# Altium schematic symbol library Regulator_Linear.SchLib: 1452 symbols (part 8 of 10)
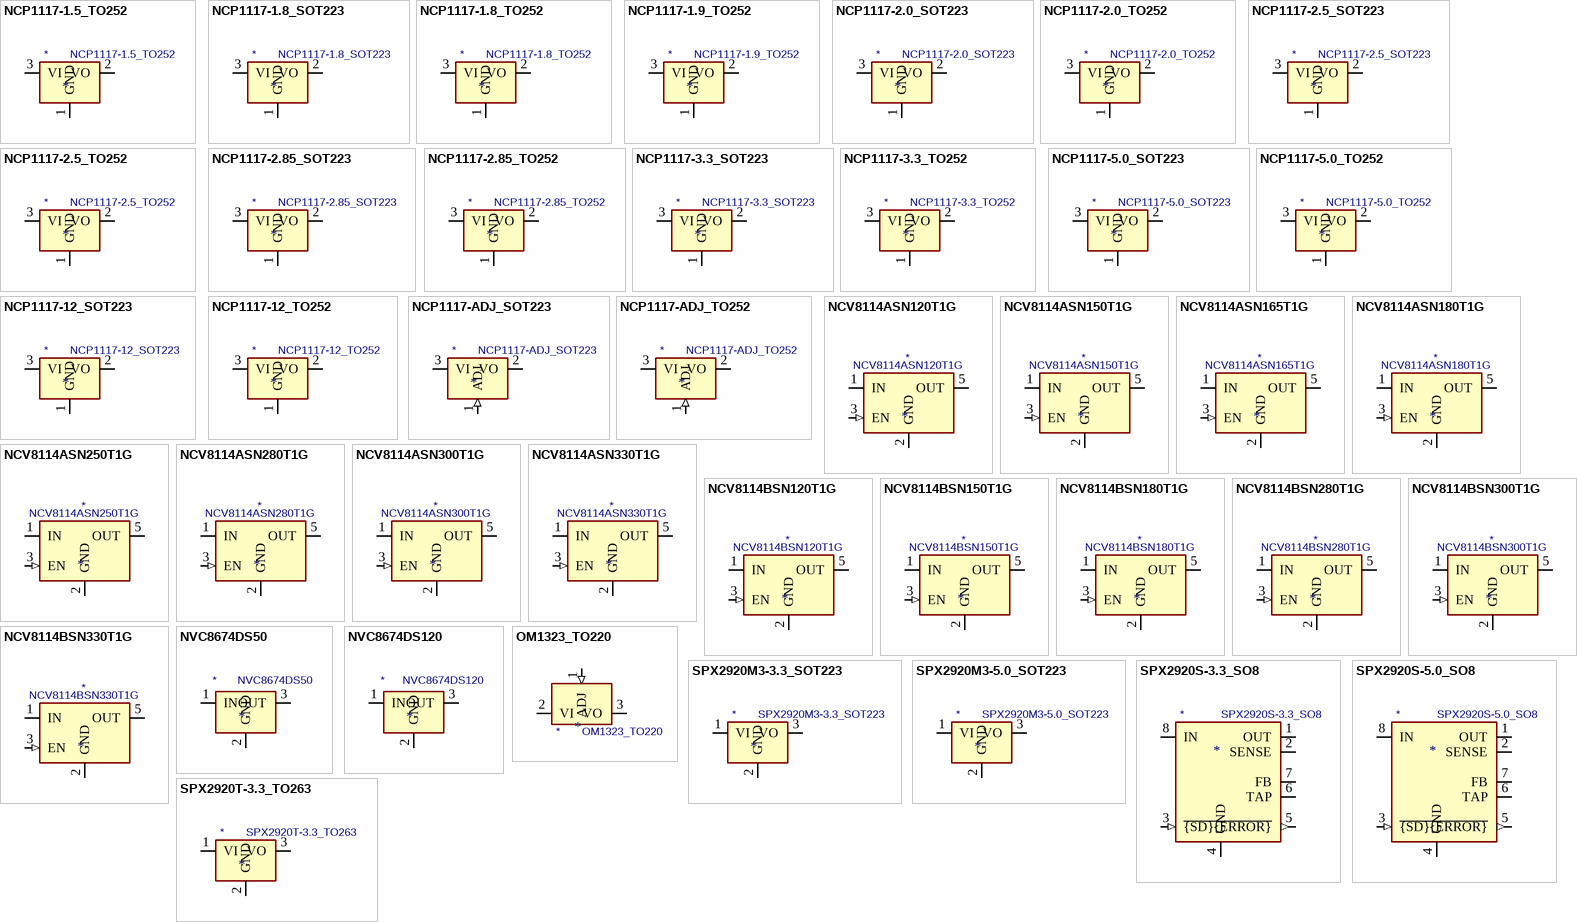
[diagram p43: symbols NCP1117-1.5_TO252 to SPX2920T-3.3_TO263]

## NCV8114ASN150T1G
designator *  value NCV8114ASN150T1G
ki_keywords: linear regulator ldo fixed positive; ki_description: 300mA, Low Noise, Linear Regulator with output active discharge function, 1.7-5.5V input voltage range, 1.5V fixed positive output, TSOT-23-5; ki_fp_filters: TSOT?23*; Footprint: Package_TO_SOT_SMD:TSOT-23-5; Supplier: https://ru.mouser.com/datasheet/2/308/NCV8114-D-1107616.pdf
footprint TSOT-23-5
pins: 1 IN (power), 2 GND (power), 3 EN (in), 4 NC (in) hidden, 5 OUT (power)

## NCV8114ASN165T1G
designator *  value NCV8114ASN165T1G
ki_keywords: linear regulator ldo fixed positive; ki_description: 300mA, Low Noise, Linear Regulator with output active discharge function, 1.7-5.5V input voltage range, 1.65V fixed positive output, TSOT-23-5; ki_fp_filters: TSOT?23*; Footprint: Package_TO_SOT_SMD:TSOT-23-5; Supplier: https://ru.mouser.com/datasheet/2/308/NCV8114-D-1107616.pdf
footprint TSOT-23-5
pins: 1 IN (power), 2 GND (power), 3 EN (in), 4 NC (in) hidden, 5 OUT (power)

## NCV8114ASN180T1G
designator *  value NCV8114ASN180T1G
ki_keywords: linear regulator ldo fixed positive; ki_description: 300mA, Low Noise, Linear Regulator with output active discharge function, 1.7-5.5V input voltage range, 1.8V fixed positive output, TSOT-23-5; ki_fp_filters: TSOT?23*; Footprint: Package_TO_SOT_SMD:TSOT-23-5; Supplier: https://ru.mouser.com/datasheet/2/308/NCV8114-D-1107616.pdf
footprint TSOT-23-5
pins: 1 IN (power), 2 GND (power), 3 EN (in), 4 NC (in) hidden, 5 OUT (power)

## NCV8114ASN250T1G
designator *  value NCV8114ASN250T1G
ki_keywords: linear regulator ldo fixed positive; ki_description: 300mA, Low Noise, Linear Regulator with output active discharge function, 1.7-5.5V input voltage range, 2.5V fixed positive output, TSOT-23-5; ki_fp_filters: TSOT?23*; Footprint: Package_TO_SOT_SMD:TSOT-23-5; Supplier: https://ru.mouser.com/datasheet/2/308/NCV8114-D-1107616.pdf
footprint TSOT-23-5
pins: 1 IN (power), 2 GND (power), 3 EN (in), 4 NC (in) hidden, 5 OUT (power)

## NCV8114ASN280T1G
designator *  value NCV8114ASN280T1G
ki_keywords: linear regulator ldo fixed positive; ki_description: 300mA, Low Noise, Linear Regulator with output active discharge function, 1.7-5.5V input voltage range, 2.8V fixed positive output, TSOT-23-5; ki_fp_filters: TSOT?23*; Footprint: Package_TO_SOT_SMD:TSOT-23-5; Supplier: https://ru.mouser.com/datasheet/2/308/NCV8114-D-1107616.pdf
footprint TSOT-23-5
pins: 1 IN (power), 2 GND (power), 3 EN (in), 4 NC (in) hidden, 5 OUT (power)

## NCV8114ASN300T1G
designator *  value NCV8114ASN300T1G
ki_keywords: linear regulator ldo fixed positive; ki_description: 300mA, Low Noise, Linear Regulator with output active discharge function, 1.7-5.5V input voltage range, 3.0V fixed positive output, TSOT-23-5; ki_fp_filters: TSOT?23*; Footprint: Package_TO_SOT_SMD:TSOT-23-5; Supplier: https://ru.mouser.com/datasheet/2/308/NCV8114-D-1107616.pdf
footprint TSOT-23-5
pins: 1 IN (power), 2 GND (power), 3 EN (in), 4 NC (in) hidden, 5 OUT (power)

## NCV8114ASN330T1G
designator *  value NCV8114ASN330T1G
ki_keywords: linear regulator ldo fixed positive; ki_description: 300mA, Low Noise, Linear Regulator with output active discharge function, 1.7-5.5V input voltage range, 3.3V fixed positive output, TSOT-23-5; ki_fp_filters: TSOT?23*; Footprint: Package_TO_SOT_SMD:TSOT-23-5; Supplier: https://ru.mouser.com/datasheet/2/308/NCV8114-D-1107616.pdf
footprint TSOT-23-5
pins: 1 IN (power), 2 GND (power), 3 EN (in), 4 NC (in) hidden, 5 OUT (power)

## NCV8114BSN120T1G
designator *  value NCV8114BSN120T1G
ki_keywords: linear regulator ldo fixed positive; ki_description: 300mA, Low Noise, Linear Regulator without output active discharge function, 1.7-5.5V input voltage range, 1.2V fixed positive output, TSOT-23-5; ki_fp_filters: TSOT?23*; Footprint: Package_TO_SOT_SMD:TSOT-23-5; Supplier: https://ru.mouser.com/datasheet/2/308/NCV8114-D-1107616.pdf
footprint TSOT-23-5
pins: 1 IN (power), 2 GND (power), 3 EN (in), 4 NC (in) hidden, 5 OUT (power)

## NCV8114BSN150T1G
designator *  value NCV8114BSN150T1G
ki_keywords: linear regulator ldo fixed positive; ki_description: 300mA, Low Noise, Linear Regulator without output active discharge function, 1.7-5.5V input voltage range, 1.5V fixed positive output, TSOT-23-5; ki_fp_filters: TSOT?23*; Footprint: Package_TO_SOT_SMD:TSOT-23-5; Supplier: https://ru.mouser.com/datasheet/2/308/NCV8114-D-1107616.pdf
footprint TSOT-23-5
pins: 1 IN (power), 2 GND (power), 3 EN (in), 4 NC (in) hidden, 5 OUT (power)

## NCV8114BSN180T1G
designator *  value NCV8114BSN180T1G
ki_keywords: linear regulator ldo fixed positive; ki_description: 300mA, Low Noise, Linear Regulator without output active discharge function, 1.7-5.5V input voltage range, 1.8V fixed positive output, TSOT-23-5; ki_fp_filters: TSOT?23*; Footprint: Package_TO_SOT_SMD:TSOT-23-5; Supplier: https://ru.mouser.com/datasheet/2/308/NCV8114-D-1107616.pdf
footprint TSOT-23-5
pins: 1 IN (power), 2 GND (power), 3 EN (in), 4 NC (in) hidden, 5 OUT (power)

## NCV8114BSN280T1G
designator *  value NCV8114BSN280T1G
ki_keywords: linear regulator ldo fixed positive; ki_description: 300mA, Low Noise, Linear Regulator without output active discharge function, 1.7-5.5V input voltage range, 2.8V fixed positive output, TSOT-23-5; ki_fp_filters: TSOT?23*; Footprint: Package_TO_SOT_SMD:TSOT-23-5; Supplier: https://ru.mouser.com/datasheet/2/308/NCV8114-D-1107616.pdf
footprint TSOT-23-5
pins: 1 IN (power), 2 GND (power), 3 EN (in), 4 NC (in) hidden, 5 OUT (power)

## NCV8114BSN300T1G
designator *  value NCV8114BSN300T1G
ki_keywords: linear regulator ldo fixed positive; ki_description: 300mA, Low Noise, Linear Regulator without output active discharge function, 1.7-5.5V input voltage range, 3.0V fixed positive output, TSOT-23-5; ki_fp_filters: TSOT?23*; Footprint: Package_TO_SOT_SMD:TSOT-23-5; Supplier: https://ru.mouser.com/datasheet/2/308/NCV8114-D-1107616.pdf
footprint TSOT-23-5
pins: 1 IN (power), 2 GND (power), 3 EN (in), 4 NC (in) hidden, 5 OUT (power)

## NCV8114BSN330T1G
designator *  value NCV8114BSN330T1G
ki_keywords: linear regulator ldo fixed positive; ki_description: 300mA, Low Noise, Linear Regulator without output active discharge function, 1.7-5.5V input voltage range, 3.3V fixed positive output, TSOT-23-5; ki_fp_filters: TSOT?23*; Footprint: Package_TO_SOT_SMD:TSOT-23-5; Supplier: https://ru.mouser.com/datasheet/2/308/NCV8114-D-1107616.pdf
footprint TSOT-23-5
pins: 1 IN (power), 2 GND (power), 3 EN (in), 4 NC (in) hidden, 5 OUT (power)

## NVC8674DS50
designator *  value NVC8674DS50
ki_keywords: ldo regulator 5V; ki_description: 350mA, 5.0V Very Low Iq Low Dropout Linear Regulator, TO-263-2; ki_fp_filters: TO*263*; Footprint: Package_TO_SOT_SMD:TO-263-2; Supplier: https://www.onsemi.com/pub/Collateral/NCV8674-D.PDF
footprint TO-263-2
pins: 1 IN (power), 2 GND (power), 3 OUT (power)

## NVC8674DS120
designator *  value NVC8674DS120
ki_keywords: ldo regulator 12V; ki_description: 350mA, 12.0V Very Low Iq Low Dropout Linear Regulator, TO-263-2; ki_fp_filters: TO*263*; Footprint: Package_TO_SOT_SMD:TO-263-2; Supplier: https://www.onsemi.com/pub/Collateral/NCV8674-D.PDF
footprint TO-263-2
pins: 1 IN (power), 2 GND (power), 3 OUT (power)

## OM1323_TO220
designator *  value OM1323_TO220
ki_keywords: Adjustable Voltage Regulator 1.5A Negative; ki_description: Negative 1.5A 35V Adjustable Linear Regulator, TO-220; ki_fp_filters: TO?220*; Footprint: Package_TO_SOT_THT:TO-220-3_Vertical; Supplier: http://www.irf.com/product-info/datasheets/hirel/om1323.pdf
footprint TO-220-3_Vertical
pins: 1 ADJ (in), 2 VI (power), 3 VO (power)

## SPX2920M3-3.3_SOT223
designator *  value SPX2920M3-3.3_SOT223
ki_keywords: REGULATOR LDO 3.3V; ki_description: 400mA Low drop-out regulator, Fixed Output 3.3V, SOT-223; ki_fp_filters: SOT?223*; Footprint: Package_TO_SOT_SMD:SOT-223-3_TabPin2; Supplier: http://www.zlgmcu.com/Sipex/LDO/PDF/spx2920.pdf
footprint SOT-223-3_TabPin2
pins: 1 VI (power), 2 GND (power), 3 VO (power)

## SPX2920M3-5.0_SOT223
designator *  value SPX2920M3-5.0_SOT223
ki_keywords: REGULATOR LDO 5V; ki_description: 400mA Low drop-out regulator, Fixed Output 5V, SOT-223; ki_fp_filters: SOT?223*; Footprint: Package_TO_SOT_SMD:SOT-223-3_TabPin2; Supplier: http://www.zlgmcu.com/Sipex/LDO/PDF/spx2920.pdf
footprint SOT-223-3_TabPin2
pins: 1 VI (power), 2 GND (power), 3 VO (power)

## SPX2920S-3.3_SO8
designator *  value SPX2920S-3.3_SO8
ki_keywords: LDO Voltage Regulator 400mA 3.3V Adjustable; ki_description: 400mA Fixed/Adjustable 1.2-20V Low Drop-out Voltage Regulator, SO-8; ki_fp_filters: SOIC*3.9x4.9mm*P1.27mm*; Footprint: Package_SO:SOIC-8_3.9x4.9mm_P1.27mm; Supplier: http://www.zlgmcu.com/Sipex/LDO/PDF/spx2920.pdf
footprint SOIC-8_3.9x4.9mm_P1.27mm
pins: 1 OUT (power), 2 SENSE, 3 ~{{SD}} (in), 4 GND (power), 5 ~{{ERROR}} (out), 6 TAP, 7 FB, 8 IN (power)

## SPX2920S-5.0_SO8
designator *  value SPX2920S-5.0_SO8
ki_keywords: LDO Voltage Regulator 400mA 5V Adjustable; ki_description: 400mA Fixed/Adjustable 1.2-20V Low Drop-out Voltage Regulator, SO-8; ki_fp_filters: SOIC*3.9x4.9mm*P1.27mm*; Footprint: Package_SO:SOIC-8_3.9x4.9mm_P1.27mm; Supplier: http://www.zlgmcu.com/Sipex/LDO/PDF/spx2920.pdf
footprint SOIC-8_3.9x4.9mm_P1.27mm
pins: 1 OUT (power), 2 SENSE, 3 ~{{SD}} (in), 4 GND (power), 5 ~{{ERROR}} (out), 6 TAP, 7 FB, 8 IN (power)

## SPX2920T-3.3_TO263
designator *  value SPX2920T-3.3_TO263
ki_keywords: REGULATOR LDO 3.3V; ki_description: 400mA Low drop-out regulator, Fixed Output 3.3V, TO-263; ki_fp_filters: TO?263*; Footprint: Package_TO_SOT_SMD:TO-263-3_TabPin2; Supplier: http://www.zlgmcu.com/Sipex/LDO/PDF/spx2920.pdf
footprint TO-263-3_TabPin2
pins: 1 VI (power), 2 GND (power), 3 VO (power)

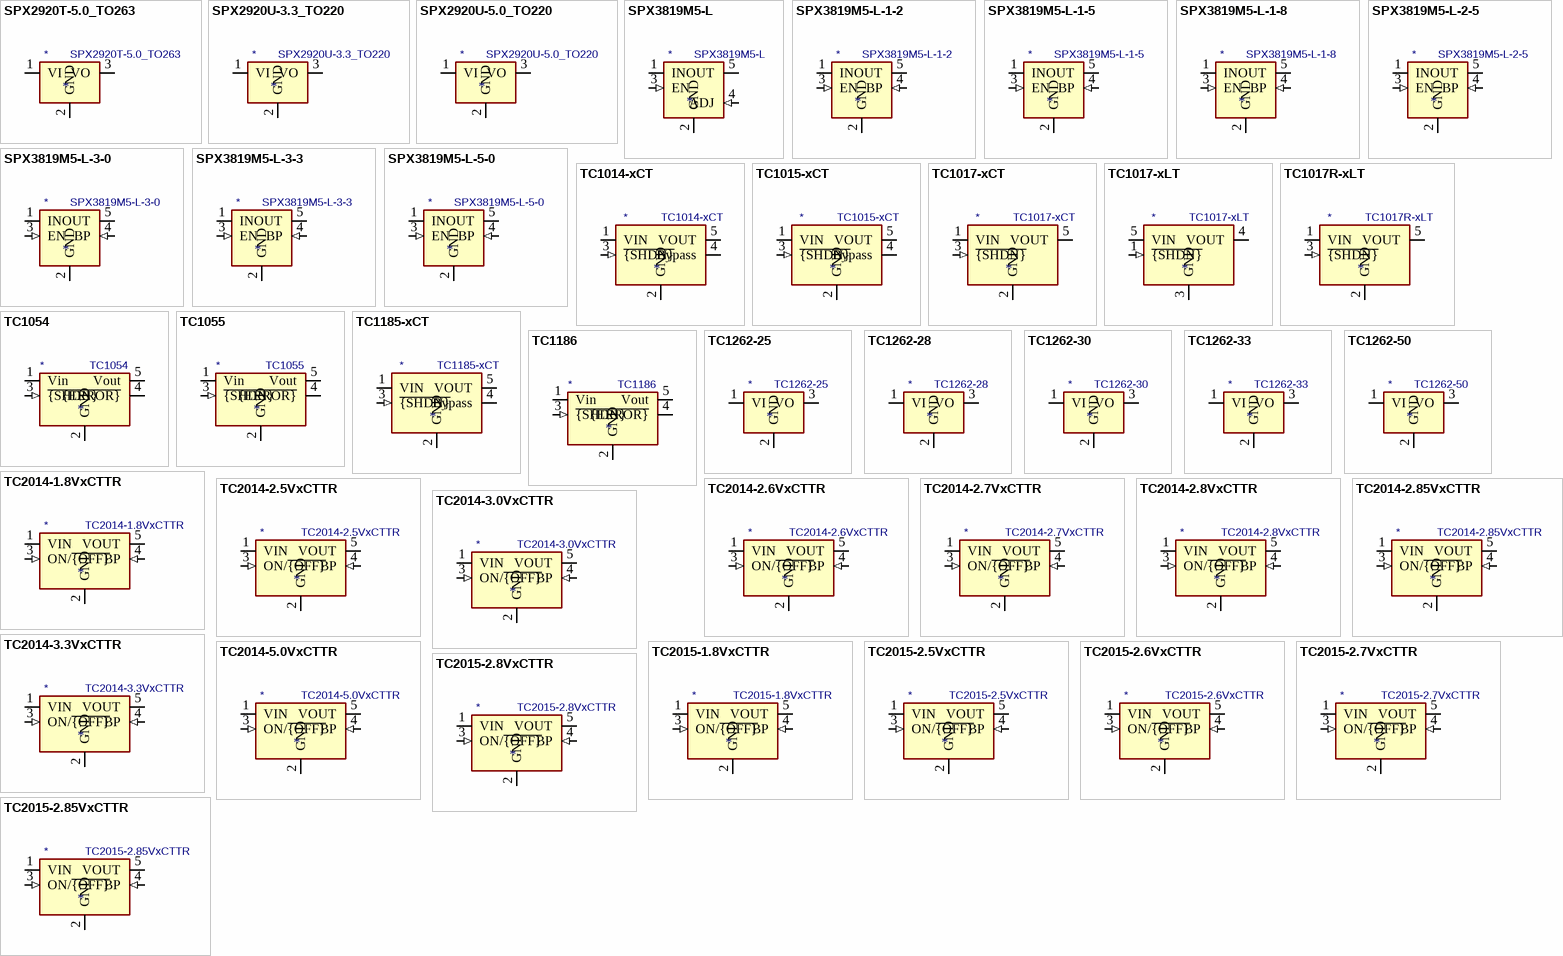
[diagram p28: symbols SPX2920T-5.0_TO263 to TC2015-2.85VxCTTR]

## SPX2920T-5.0_TO263
designator *  value SPX2920T-5.0_TO263
ki_keywords: REGULATOR LDO 5V; ki_description: 400mA Low drop-out regulator, Fixed Output 5V, TO-263; ki_fp_filters: TO?263*; Footprint: Package_TO_SOT_SMD:TO-263-3_TabPin2; Supplier: http://www.zlgmcu.com/Sipex/LDO/PDF/spx2920.pdf
footprint TO-263-3_TabPin2
pins: 1 VI (power), 2 GND (power), 3 VO (power)

## SPX2920U-3.3_TO220
designator *  value SPX2920U-3.3_TO220
ki_keywords: REGULATOR LDO 3.3V; ki_description: 400mA Low drop-out regulator, Fixed Output 3.3V, TO-220; ki_fp_filters: TO?220*; Footprint: Package_TO_SOT_THT:TO-220-3_Vertical; Supplier: http://www.zlgmcu.com/Sipex/LDO/PDF/spx2920.pdf
footprint TO-220-3_Vertical
pins: 1 VI (power), 2 GND (power), 3 VO (power)

## SPX2920U-5.0_TO220
designator *  value SPX2920U-5.0_TO220
ki_keywords: REGULATOR LDO 5V; ki_description: 400mA Low drop-out regulator, Fixed Output 5V, TO-220; ki_fp_filters: TO?220*; Footprint: Package_TO_SOT_THT:TO-220-3_Vertical; Supplier: http://www.zlgmcu.com/Sipex/LDO/PDF/spx2920.pdf
footprint TO-220-3_Vertical
pins: 1 VI (power), 2 GND (power), 3 VO (power)

## SPX3819M5-L
designator *  value SPX3819M5-L
ki_keywords: REGULATOR LDO ADJ; ki_description: 500mA Low drop-out regulator, Adjustable, SOT-23-5; ki_fp_filters: SOT?23*; Footprint: Package_TO_SOT_SMD:SOT-23-5; Supplier: https://www.exar.com/content/document.ashx?id=22106&languageid=1033&type=Datasheet&partnumber=SPX3819&filename=SPX3819.pdf&part=SPX3819
footprint SOT-23-5
pins: 1 IN (power), 2 GND (power), 3 EN (in), 4 ADJ (in), 5 OUT (power)

## SPX3819M5-L-1-2
designator *  value SPX3819M5-L-1-2
ki_keywords: REGULATOR LDO 1.2V; ki_description: 500mA Low drop-out regulator, Fixed Output 1.2V, SOT-23-5; ki_fp_filters: SOT?23*; Footprint: Package_TO_SOT_SMD:SOT-23-5; Supplier: https://www.exar.com/content/document.ashx?id=22106&languageid=1033&type=Datasheet&partnumber=SPX3819&filename=SPX3819.pdf&part=SPX3819
footprint SOT-23-5
pins: 1 IN (power), 2 GND (power), 3 EN (in), 4 BP (in), 5 OUT (power)

## SPX3819M5-L-1-5
designator *  value SPX3819M5-L-1-5
ki_keywords: REGULATOR LDO 1.5V; ki_description: 500mA Low drop-out regulator, Fixed Output 1.5V, SOT-23-5; ki_fp_filters: SOT?23*; Footprint: Package_TO_SOT_SMD:SOT-23-5; Supplier: https://www.exar.com/content/document.ashx?id=22106&languageid=1033&type=Datasheet&partnumber=SPX3819&filename=SPX3819.pdf&part=SPX3819
footprint SOT-23-5
pins: 1 IN (power), 2 GND (power), 3 EN (in), 4 BP (in), 5 OUT (power)

## SPX3819M5-L-1-8
designator *  value SPX3819M5-L-1-8
ki_keywords: REGULATOR LDO 1.8V; ki_description: 500mA Low drop-out regulator, Fixed Output 1.8V, SOT-23-5; ki_fp_filters: SOT?23*; Footprint: Package_TO_SOT_SMD:SOT-23-5; Supplier: https://www.exar.com/content/document.ashx?id=22106&languageid=1033&type=Datasheet&partnumber=SPX3819&filename=SPX3819.pdf&part=SPX3819
footprint SOT-23-5
pins: 1 IN (power), 2 GND (power), 3 EN (in), 4 BP (in), 5 OUT (power)

## SPX3819M5-L-2-5
designator *  value SPX3819M5-L-2-5
ki_keywords: REGULATOR LDO 2.5V; ki_description: 500mA Low drop-out regulator, Fixed Output 2.5V, SOT-23-5; ki_fp_filters: SOT?23*; Footprint: Package_TO_SOT_SMD:SOT-23-5; Supplier: https://www.exar.com/content/document.ashx?id=22106&languageid=1033&type=Datasheet&partnumber=SPX3819&filename=SPX3819.pdf&part=SPX3819
footprint SOT-23-5
pins: 1 IN (power), 2 GND (power), 3 EN (in), 4 BP (in), 5 OUT (power)

## SPX3819M5-L-3-0
designator *  value SPX3819M5-L-3-0
ki_keywords: REGULATOR LDO 3.0V; ki_description: 500mA Low drop-out regulator, Fixed Output 3.0V, SOT-23-5; ki_fp_filters: SOT?23*; Footprint: Package_TO_SOT_SMD:SOT-23-5; Supplier: https://www.exar.com/content/document.ashx?id=22106&languageid=1033&type=Datasheet&partnumber=SPX3819&filename=SPX3819.pdf&part=SPX3819
footprint SOT-23-5
pins: 1 IN (power), 2 GND (power), 3 EN (in), 4 BP (in), 5 OUT (power)

## SPX3819M5-L-3-3
designator *  value SPX3819M5-L-3-3
ki_keywords: REGULATOR LDO 3.3V; ki_description: 500mA Low drop-out regulator, Fixed Output 3.3V, SOT-23-5; ki_fp_filters: SOT?23*; Footprint: Package_TO_SOT_SMD:SOT-23-5; Supplier: https://www.exar.com/content/document.ashx?id=22106&languageid=1033&type=Datasheet&partnumber=SPX3819&filename=SPX3819.pdf&part=SPX3819
footprint SOT-23-5
pins: 1 IN (power), 2 GND (power), 3 EN (in), 4 BP (in), 5 OUT (power)

## SPX3819M5-L-5-0
designator *  value SPX3819M5-L-5-0
ki_keywords: REGULATOR LDO 5.0V; ki_description: 500mA Low drop-out regulator, Fixed Output 5.0V, SOT-23-5; ki_fp_filters: SOT?23*; Footprint: Package_TO_SOT_SMD:SOT-23-5; Supplier: https://www.exar.com/content/document.ashx?id=22106&languageid=1033&type=Datasheet&partnumber=SPX3819&filename=SPX3819.pdf&part=SPX3819
footprint SOT-23-5
pins: 1 IN (power), 2 GND (power), 3 EN (in), 4 BP (in), 5 OUT (power)

## TC1014-xCT
designator *  value TC1014-xCT
ki_keywords: LDO Linear Voltage Regulator; ki_description: 50 mA CMOS LDOs with Shutdown and Reference Bypass, SOT-23-5; ki_fp_filters: SOT?23*; Footprint: Package_TO_SOT_SMD:SOT-23-5; Supplier: https://ww1.microchip.com/downloads/aemDocuments/documents/APID/ProductDocuments/DataSheets/21335e.pdf
footprint SOT-23-5
pins: 1 VIN (power), 2 GND (power), 3 ~{{SHDN}} (in), 4 Bypass, 5 VOUT (power)

## TC1015-xCT
designator *  value TC1015-xCT
ki_keywords: LDO Linear Voltage Regulator; ki_description: 100 mA CMOS LDOs with Shutdown and Reference Bypass, SOT-23-5; ki_fp_filters: SOT?23*; Footprint: Package_TO_SOT_SMD:SOT-23-5; Supplier: https://ww1.microchip.com/downloads/aemDocuments/documents/APID/ProductDocuments/DataSheets/21335e.pdf
footprint SOT-23-5
pins: 1 VIN (power), 2 GND (power), 3 ~{{SHDN}} (in), 4 Bypass, 5 VOUT (power)

## TC1017-xCT
designator *  value TC1017-xCT
ki_keywords: LDO Linear Voltage Regulator; ki_description: 150mA, Tiny CMOS LDO With Shutdown, SOT-23-5; ki_fp_filters: SOT?23*; Footprint: Package_TO_SOT_SMD:SOT-23-5; Supplier: http://ww1.microchip.com/downloads/en/DeviceDoc/21813F.pdf
footprint SOT-23-5
pins: 1 VIN (power), 2 GND (power), 3 ~{{SHDN}} (in), 4 NC (in) hidden, 5 VOUT (power)

## TC1017-xLT
designator *  value TC1017-xLT
ki_keywords: LDO Linear Voltage Regulator; ki_description: 150mA, Tiny CMOS LDO With Shutdown, SC-70-5; ki_fp_filters: SOT*353*; Footprint: Package_TO_SOT_SMD:SOT-353_SC-70-5; Supplier: http://ww1.microchip.com/downloads/en/DeviceDoc/21813F.pdf
footprint SOT-353_SC-70-5
pins: 1 ~{{SHDN}} (in), 2 NC (in) hidden, 3 GND (power), 4 VOUT (power), 5 VIN (power)

## TC1017R-xLT
designator *  value TC1017R-xLT
ki_keywords: LDO Linear Voltage Regulator; ki_description: 150mA, Tiny CMOS LDO With Shutdown, SC-70-5; ki_fp_filters: SOT*353*; Footprint: Package_TO_SOT_SMD:SOT-353_SC-70-5; Supplier: http://ww1.microchip.com/downloads/en/DeviceDoc/21813F.pdf
footprint SOT-353_SC-70-5
pins: 1 VIN (power), 2 GND (power), 3 ~{{SHDN}} (in), 4 NC (in) hidden, 5 VOUT (power)

## TC1054
designator *  value TC1054
ki_keywords: LDO regulator voltage; ki_description: 50mA Low Dropout Regulator with ERROR output in 5-Pin SOT-23 package; ki_fp_filters: SOT?23*; Footprint: Package_TO_SOT_SMD:SOT-23-5; Supplier: http://ww1.microchip.com/downloads/en/DeviceDoc/21350E.pdf
footprint SOT-23-5
pins: 1 Vin (power), 2 GND (power), 3 ~{{SHDN}} (in), 4 ~{{ERROR}} (oc), 5 Vout (power)

## TC1055
designator *  value TC1055
ki_keywords: LDO regulator voltage; ki_description: 100mA Low Dropout Regulator with ERROR output in 5-Pin SOT-23 package; ki_fp_filters: SOT?23*; Footprint: Package_TO_SOT_SMD:SOT-23-5; Supplier: http://ww1.microchip.com/downloads/en/DeviceDoc/21350E.pdf
footprint SOT-23-5
pins: 1 Vin (power), 2 GND (power), 3 ~{{SHDN}} (in), 4 ~{{ERROR}} (oc), 5 Vout (power)

## TC1185-xCT
designator *  value TC1185-xCT
ki_keywords: LDO Linear Voltage Regulator; ki_description: 150 mA CMOS LDOs with Shutdown and Reference Bypass, SOT-23-5; ki_fp_filters: SOT?23*; Footprint: Package_TO_SOT_SMD:SOT-23-5; Supplier: https://ww1.microchip.com/downloads/aemDocuments/documents/APID/ProductDocuments/DataSheets/21335e.pdf
footprint SOT-23-5
pins: 1 VIN (power), 2 GND (power), 3 ~{{SHDN}} (in), 4 Bypass, 5 VOUT (power)

## TC1186
designator *  value TC1186
ki_keywords: LDO regulator voltage; ki_description: 150mA Low Dropout Regulator with ERROR output in 5-Pin SOT-23 package; ki_fp_filters: SOT?23*; Footprint: Package_TO_SOT_SMD:SOT-23-5; Supplier: http://ww1.microchip.com/downloads/en/DeviceDoc/21350E.pdf
footprint SOT-23-5
pins: 1 Vin (power), 2 GND (power), 3 ~{{SHDN}} (in), 4 ~{{ERROR}} (oc), 5 Vout (power)

## TC1262-25
designator *  value TC1262-25
ki_keywords: Voltage Regulator 2.5V 500mA Positive CMOS LDO Microchip; ki_description: 500mA Low Dropout CMOS Voltage Regulator, Fixed Output 2.5V, TO-220/SOT-223/TO-263; ki_fp_filters: SOT?223* TO?220* TO?263*; Supplier: http://ww1.microchip.com/downloads/en/DeviceDoc/21373C.pdf
pins: 1 VI (power), 2 GND (power), 3 VO (power)

## TC1262-28
designator *  value TC1262-28
ki_keywords: Voltage Regulator 2.8V 500mA Positive CMOS LDO Microchip; ki_description: 500mA Low Dropout CMOS Voltage Regulator, Fixed Output 2.8V, TO-220/SOT-223/TO-263; ki_fp_filters: SOT?223* TO?220* TO?263*; Supplier: http://ww1.microchip.com/downloads/en/DeviceDoc/21373C.pdf
pins: 1 VI (power), 2 GND (power), 3 VO (power)

## TC1262-30
designator *  value TC1262-30
ki_keywords: Voltage Regulator 3.0V 500mA Positive CMOS LDO Microchip; ki_description: 500mA Low Dropout CMOS Voltage Regulator, Fixed Output 3.0V, TO-220/SOT-223/TO-263; ki_fp_filters: SOT?223* TO?220* TO?263*; Supplier: http://ww1.microchip.com/downloads/en/DeviceDoc/21373C.pdf
pins: 1 VI (power), 2 GND (power), 3 VO (power)

## TC1262-33
designator *  value TC1262-33
ki_keywords: Voltage Regulator 3.3V 500mA Positive CMOS LDO Microchip; ki_description: 500mA Low Dropout CMOS Voltage Regulator, Fixed Output 3.3V, TO-220/SOT-223/TO-263; ki_fp_filters: SOT?223* TO?220* TO?263*; Supplier: http://ww1.microchip.com/downloads/en/DeviceDoc/21373C.pdf
pins: 1 VI (power), 2 GND (power), 3 VO (power)

## TC1262-50
designator *  value TC1262-50
ki_keywords: Voltage Regulator 5.0V 500mA Positive CMOS LDO Microchip; ki_description: 500mA Low Dropout CMOS Voltage Regulator, Fixed Output 5.0V, TO-220/SOT-223/TO-263; ki_fp_filters: SOT?223* TO?220* TO?263*; Supplier: http://ww1.microchip.com/downloads/en/DeviceDoc/21373C.pdf
pins: 1 VI (power), 2 GND (power), 3 VO (power)

## TC2014-1.8VxCTTR
designator *  value TC2014-1.8VxCTTR
ki_keywords: low dropout 1.8V 50mA; ki_description: 1.8V 50mA CMOS LDO with Shutdown and Vref Bypass, SOT-23-5; ki_fp_filters: SOT?23*; Footprint: Package_TO_SOT_SMD:SOT-23-5; Supplier: http://ww1.microchip.com/downloads/en/DeviceDoc/21662F.pdf
footprint SOT-23-5
pins: 1 VIN (power), 2 GND (power), 3 ON/~{{OFF}} (in), 4 BP (in), 5 VOUT (power)

## TC2014-2.5VxCTTR
designator *  value TC2014-2.5VxCTTR
ki_keywords: low dropout 2.5V 50mA; ki_description: 2.5V 50mA CMOS LDO with Shutdown and Vref Bypass, SOT-23-5; ki_fp_filters: SOT?23*; Footprint: Package_TO_SOT_SMD:SOT-23-5; Supplier: http://ww1.microchip.com/downloads/en/DeviceDoc/21662F.pdf
footprint SOT-23-5
pins: 1 VIN (power), 2 GND (power), 3 ON/~{{OFF}} (in), 4 BP (in), 5 VOUT (power)

## TC2014-2.6VxCTTR
designator *  value TC2014-2.6VxCTTR
ki_keywords: low dropout 2.6V 50mA; ki_description: 2.6V 50mA CMOS LDO with Shutdown and Vref Bypass, SOT-23-5; ki_fp_filters: SOT?23*; Footprint: Package_TO_SOT_SMD:SOT-23-5; Supplier: http://ww1.microchip.com/downloads/en/DeviceDoc/21662F.pdf
footprint SOT-23-5
pins: 1 VIN (power), 2 GND (power), 3 ON/~{{OFF}} (in), 4 BP (in), 5 VOUT (power)

## TC2014-2.7VxCTTR
designator *  value TC2014-2.7VxCTTR
ki_keywords: low dropout 2.7V 50mA; ki_description: 2.7V 50mA CMOS LDO with Shutdown and Vref Bypass, SOT-23-5; ki_fp_filters: SOT?23*; Footprint: Package_TO_SOT_SMD:SOT-23-5; Supplier: http://ww1.microchip.com/downloads/en/DeviceDoc/21662F.pdf
footprint SOT-23-5
pins: 1 VIN (power), 2 GND (power), 3 ON/~{{OFF}} (in), 4 BP (in), 5 VOUT (power)

## TC2014-2.8VxCTTR
designator *  value TC2014-2.8VxCTTR
ki_keywords: low dropout 2.8V 50mA; ki_description: 2.8V 50mA CMOS LDO with Shutdown and Vref Bypass, SOT-23-5; ki_fp_filters: SOT?23*; Footprint: Package_TO_SOT_SMD:SOT-23-5; Supplier: http://ww1.microchip.com/downloads/en/DeviceDoc/21662F.pdf
footprint SOT-23-5
pins: 1 VIN (power), 2 GND (power), 3 ON/~{{OFF}} (in), 4 BP (in), 5 VOUT (power)

## TC2014-2.85VxCTTR
designator *  value TC2014-2.85VxCTTR
ki_keywords: low dropout 2.85V 50mA; ki_description: 2.85V 50mA CMOS LDO with Shutdown and Vref Bypass, SOT-23-5; ki_fp_filters: SOT?23*; Footprint: Package_TO_SOT_SMD:SOT-23-5; Supplier: http://ww1.microchip.com/downloads/en/DeviceDoc/21662F.pdf
footprint SOT-23-5
pins: 1 VIN (power), 2 GND (power), 3 ON/~{{OFF}} (in), 4 BP (in), 5 VOUT (power)

## TC2014-3.0VxCTTR
designator *  value TC2014-3.0VxCTTR
ki_keywords: low dropout 3.0V 50mA; ki_description: 3.0V 50mA CMOS LDO with Shutdown and Vref Bypass, SOT-23-5; ki_fp_filters: SOT?23*; Footprint: Package_TO_SOT_SMD:SOT-23-5; Supplier: http://ww1.microchip.com/downloads/en/DeviceDoc/21662F.pdf
footprint SOT-23-5
pins: 1 VIN (power), 2 GND (power), 3 ON/~{{OFF}} (in), 4 BP (in), 5 VOUT (power)

## TC2014-3.3VxCTTR
designator *  value TC2014-3.3VxCTTR
ki_keywords: low dropout 3.3V 50mA; ki_description: 3.3V 50mA CMOS LDO with Shutdown and Vref Bypass, SOT-23-5; ki_fp_filters: SOT?23*; Footprint: Package_TO_SOT_SMD:SOT-23-5; Supplier: http://ww1.microchip.com/downloads/en/DeviceDoc/21662F.pdf
footprint SOT-23-5
pins: 1 VIN (power), 2 GND (power), 3 ON/~{{OFF}} (in), 4 BP (in), 5 VOUT (power)

## TC2014-5.0VxCTTR
designator *  value TC2014-5.0VxCTTR
ki_keywords: low dropout 5.0V 50mA; ki_description: 5.0V 50mA CMOS LDO with Shutdown and Vref Bypass, SOT-23-5; ki_fp_filters: SOT?23*; Footprint: Package_TO_SOT_SMD:SOT-23-5; Supplier: http://ww1.microchip.com/downloads/en/DeviceDoc/21662F.pdf
footprint SOT-23-5
pins: 1 VIN (power), 2 GND (power), 3 ON/~{{OFF}} (in), 4 BP (in), 5 VOUT (power)

## TC2015-1.8VxCTTR
designator *  value TC2015-1.8VxCTTR
ki_keywords: low dropout 1.8V 100mA; ki_description: 1.8V 100mA CMOS LDO with Shutdown and Vref Bypass, SOT-23-5; ki_fp_filters: SOT?23*; Footprint: Package_TO_SOT_SMD:SOT-23-5; Supplier: http://ww1.microchip.com/downloads/en/DeviceDoc/21662F.pdf
footprint SOT-23-5
pins: 1 VIN (power), 2 GND (power), 3 ON/~{{OFF}} (in), 4 BP (in), 5 VOUT (power)

## TC2015-2.5VxCTTR
designator *  value TC2015-2.5VxCTTR
ki_keywords: low dropout 2.5V 100mA; ki_description: 2.5V 100mA CMOS LDO with Shutdown and Vref Bypass, SOT-23-5; ki_fp_filters: SOT?23*; Footprint: Package_TO_SOT_SMD:SOT-23-5; Supplier: http://ww1.microchip.com/downloads/en/DeviceDoc/21662F.pdf
footprint SOT-23-5
pins: 1 VIN (power), 2 GND (power), 3 ON/~{{OFF}} (in), 4 BP (in), 5 VOUT (power)

## TC2015-2.6VxCTTR
designator *  value TC2015-2.6VxCTTR
ki_keywords: low dropout 2.6V 100mA; ki_description: 2.6V 100mA CMOS LDO with Shutdown and Vref Bypass, SOT-23-5; ki_fp_filters: SOT?23*; Footprint: Package_TO_SOT_SMD:SOT-23-5; Supplier: http://ww1.microchip.com/downloads/en/DeviceDoc/21662F.pdf
footprint SOT-23-5
pins: 1 VIN (power), 2 GND (power), 3 ON/~{{OFF}} (in), 4 BP (in), 5 VOUT (power)

## TC2015-2.7VxCTTR
designator *  value TC2015-2.7VxCTTR
ki_keywords: low dropout 2.7V 100mA; ki_description: 2.7V 100mA CMOS LDO with Shutdown and Vref Bypass, SOT-23-5; ki_fp_filters: SOT?23*; Footprint: Package_TO_SOT_SMD:SOT-23-5; Supplier: http://ww1.microchip.com/downloads/en/DeviceDoc/21662F.pdf
footprint SOT-23-5
pins: 1 VIN (power), 2 GND (power), 3 ON/~{{OFF}} (in), 4 BP (in), 5 VOUT (power)

## TC2015-2.8VxCTTR
designator *  value TC2015-2.8VxCTTR
ki_keywords: low dropout 2.8V 100mA; ki_description: 2.8V 100mA CMOS LDO with Shutdown and Vref Bypass, SOT-23-5; ki_fp_filters: SOT?23*; Footprint: Package_TO_SOT_SMD:SOT-23-5; Supplier: http://ww1.microchip.com/downloads/en/DeviceDoc/21662F.pdf
footprint SOT-23-5
pins: 1 VIN (power), 2 GND (power), 3 ON/~{{OFF}} (in), 4 BP (in), 5 VOUT (power)

## TC2015-2.85VxCTTR
designator *  value TC2015-2.85VxCTTR
ki_keywords: low dropout 2.85V 100mA; ki_description: 2.85V 100mA CMOS LDO with Shutdown and Vref Bypass, SOT-23-5; ki_fp_filters: SOT?23*; Footprint: Package_TO_SOT_SMD:SOT-23-5; Supplier: http://ww1.microchip.com/downloads/en/DeviceDoc/21662F.pdf
footprint SOT-23-5
pins: 1 VIN (power), 2 GND (power), 3 ON/~{{OFF}} (in), 4 BP (in), 5 VOUT (power)

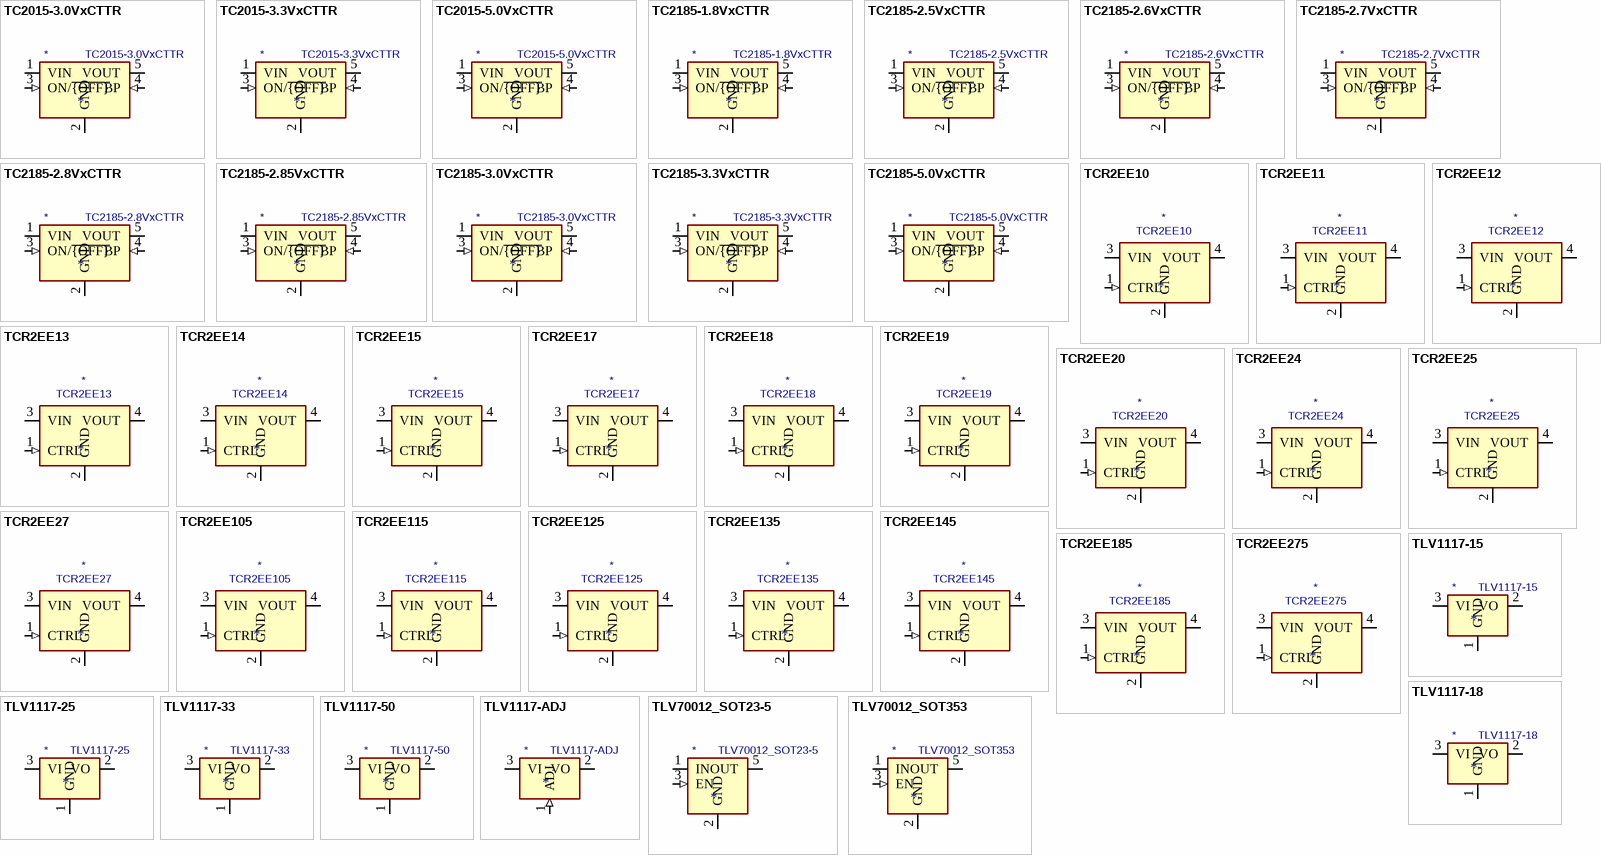
[diagram p29: symbols TC2015-3.0VxCTTR to TLV70012_SOT353]

## TC2015-3.0VxCTTR
designator *  value TC2015-3.0VxCTTR
ki_keywords: low dropout 3.0V 100mA; ki_description: 3.0V 100mA CMOS LDO with Shutdown and Vref Bypass, SOT-23-5; ki_fp_filters: SOT?23*; Footprint: Package_TO_SOT_SMD:SOT-23-5; Supplier: http://ww1.microchip.com/downloads/en/DeviceDoc/21662F.pdf
footprint SOT-23-5
pins: 1 VIN (power), 2 GND (power), 3 ON/~{{OFF}} (in), 4 BP (in), 5 VOUT (power)

## TC2015-3.3VxCTTR
designator *  value TC2015-3.3VxCTTR
ki_keywords: low dropout 3.3V 100mA; ki_description: 3.3V 100mA CMOS LDO with Shutdown and Vref Bypass, SOT-23-5; ki_fp_filters: SOT?23*; Footprint: Package_TO_SOT_SMD:SOT-23-5; Supplier: http://ww1.microchip.com/downloads/en/DeviceDoc/21662F.pdf
footprint SOT-23-5
pins: 1 VIN (power), 2 GND (power), 3 ON/~{{OFF}} (in), 4 BP (in), 5 VOUT (power)

## TC2015-5.0VxCTTR
designator *  value TC2015-5.0VxCTTR
ki_keywords: low dropout 5.0V 100mA; ki_description: 5.0V 100mA CMOS LDO with Shutdown and Vref Bypass, SOT-23-5; ki_fp_filters: SOT?23*; Footprint: Package_TO_SOT_SMD:SOT-23-5; Supplier: http://ww1.microchip.com/downloads/en/DeviceDoc/21662F.pdf
footprint SOT-23-5
pins: 1 VIN (power), 2 GND (power), 3 ON/~{{OFF}} (in), 4 BP (in), 5 VOUT (power)

## TC2185-1.8VxCTTR
designator *  value TC2185-1.8VxCTTR
ki_keywords: low dropout 1.8V 150mA; ki_description: 1.8V 150mA CMOS LDO with Shutdown and Vref Bypass, SOT-23-5; ki_fp_filters: SOT?23*; Footprint: Package_TO_SOT_SMD:SOT-23-5; Supplier: http://ww1.microchip.com/downloads/en/DeviceDoc/21662F.pdf
footprint SOT-23-5
pins: 1 VIN (power), 2 GND (power), 3 ON/~{{OFF}} (in), 4 BP (in), 5 VOUT (power)

## TC2185-2.5VxCTTR
designator *  value TC2185-2.5VxCTTR
ki_keywords: low dropout 2.5V 150mA; ki_description: 2.5V 150mA CMOS LDO with Shutdown and Vref Bypass, SOT-23-5; ki_fp_filters: SOT?23*; Footprint: Package_TO_SOT_SMD:SOT-23-5; Supplier: http://ww1.microchip.com/downloads/en/DeviceDoc/21662F.pdf
footprint SOT-23-5
pins: 1 VIN (power), 2 GND (power), 3 ON/~{{OFF}} (in), 4 BP (in), 5 VOUT (power)

## TC2185-2.6VxCTTR
designator *  value TC2185-2.6VxCTTR
ki_keywords: low dropout 2.6V 150mA; ki_description: 2.6V 150mA CMOS LDO with Shutdown and Vref Bypass, SOT-23-5; ki_fp_filters: SOT?23*; Footprint: Package_TO_SOT_SMD:SOT-23-5; Supplier: http://ww1.microchip.com/downloads/en/DeviceDoc/21662F.pdf
footprint SOT-23-5
pins: 1 VIN (power), 2 GND (power), 3 ON/~{{OFF}} (in), 4 BP (in), 5 VOUT (power)

## TC2185-2.7VxCTTR
designator *  value TC2185-2.7VxCTTR
ki_keywords: low dropout 2.7V 150mA; ki_description: 2.7V 150mA CMOS LDO with Shutdown and Vref Bypass, SOT-23-5; ki_fp_filters: SOT?23*; Footprint: Package_TO_SOT_SMD:SOT-23-5; Supplier: http://ww1.microchip.com/downloads/en/DeviceDoc/21662F.pdf
footprint SOT-23-5
pins: 1 VIN (power), 2 GND (power), 3 ON/~{{OFF}} (in), 4 BP (in), 5 VOUT (power)

## TC2185-2.8VxCTTR
designator *  value TC2185-2.8VxCTTR
ki_keywords: low dropout 2.8V 150mA; ki_description: 2.8V 150mA CMOS LDO with Shutdown and Vref Bypass, SOT-23-5; ki_fp_filters: SOT?23*; Footprint: Package_TO_SOT_SMD:SOT-23-5; Supplier: http://ww1.microchip.com/downloads/en/DeviceDoc/21662F.pdf
footprint SOT-23-5
pins: 1 VIN (power), 2 GND (power), 3 ON/~{{OFF}} (in), 4 BP (in), 5 VOUT (power)

## TC2185-2.85VxCTTR
designator *  value TC2185-2.85VxCTTR
ki_keywords: low dropout 2.85V 150mA; ki_description: 2.85V 150mA CMOS LDO with Shutdown and Vref Bypass, SOT-23-5; ki_fp_filters: SOT?23*; Footprint: Package_TO_SOT_SMD:SOT-23-5; Supplier: http://ww1.microchip.com/downloads/en/DeviceDoc/21662F.pdf
footprint SOT-23-5
pins: 1 VIN (power), 2 GND (power), 3 ON/~{{OFF}} (in), 4 BP (in), 5 VOUT (power)

## TC2185-3.0VxCTTR
designator *  value TC2185-3.0VxCTTR
ki_keywords: low dropout 3.0V 150mA; ki_description: 3.0V 50mA CMOS LDO with Shutdown and Vref Bypass, SOT-23-5; ki_fp_filters: SOT?23*; Footprint: Package_TO_SOT_SMD:SOT-23-5; Supplier: http://ww1.microchip.com/downloads/en/DeviceDoc/21662F.pdf
footprint SOT-23-5
pins: 1 VIN (power), 2 GND (power), 3 ON/~{{OFF}} (in), 4 BP (in), 5 VOUT (power)

## TC2185-3.3VxCTTR
designator *  value TC2185-3.3VxCTTR
ki_keywords: low dropout 3.3V 150mA; ki_description: 3.3V 150mA CMOS LDO with Shutdown and Vref Bypass, SOT-23-5; ki_fp_filters: SOT?23*; Footprint: Package_TO_SOT_SMD:SOT-23-5; Supplier: http://ww1.microchip.com/downloads/en/DeviceDoc/21662F.pdf
footprint SOT-23-5
pins: 1 VIN (power), 2 GND (power), 3 ON/~{{OFF}} (in), 4 BP (in), 5 VOUT (power)

## TC2185-5.0VxCTTR
designator *  value TC2185-5.0VxCTTR
ki_keywords: low dropout 5.0V 150mA; ki_description: 5.0V 150mA CMOS LDO with Shutdown and Vref Bypass, SOT-23-5; ki_fp_filters: SOT?23*; Footprint: Package_TO_SOT_SMD:SOT-23-5; Supplier: http://ww1.microchip.com/downloads/en/DeviceDoc/21662F.pdf
footprint SOT-23-5
pins: 1 VIN (power), 2 GND (power), 3 ON/~{{OFF}} (in), 4 BP (in), 5 VOUT (power)
